# Altium footprint library pcb_ConnectorGeneral.PcbLib: 111 footprints (part 7 of 7)
Each footprint in its own frame and in the unit in brackets; x right, y up, seen from the top. Pads: shape width x height; smd on the part's side, far side on the other; paste and mask are expansions set on the pad; w line width, h text height; cw(c..) or ccw(c..) is an arc to the next point about the centre after c.
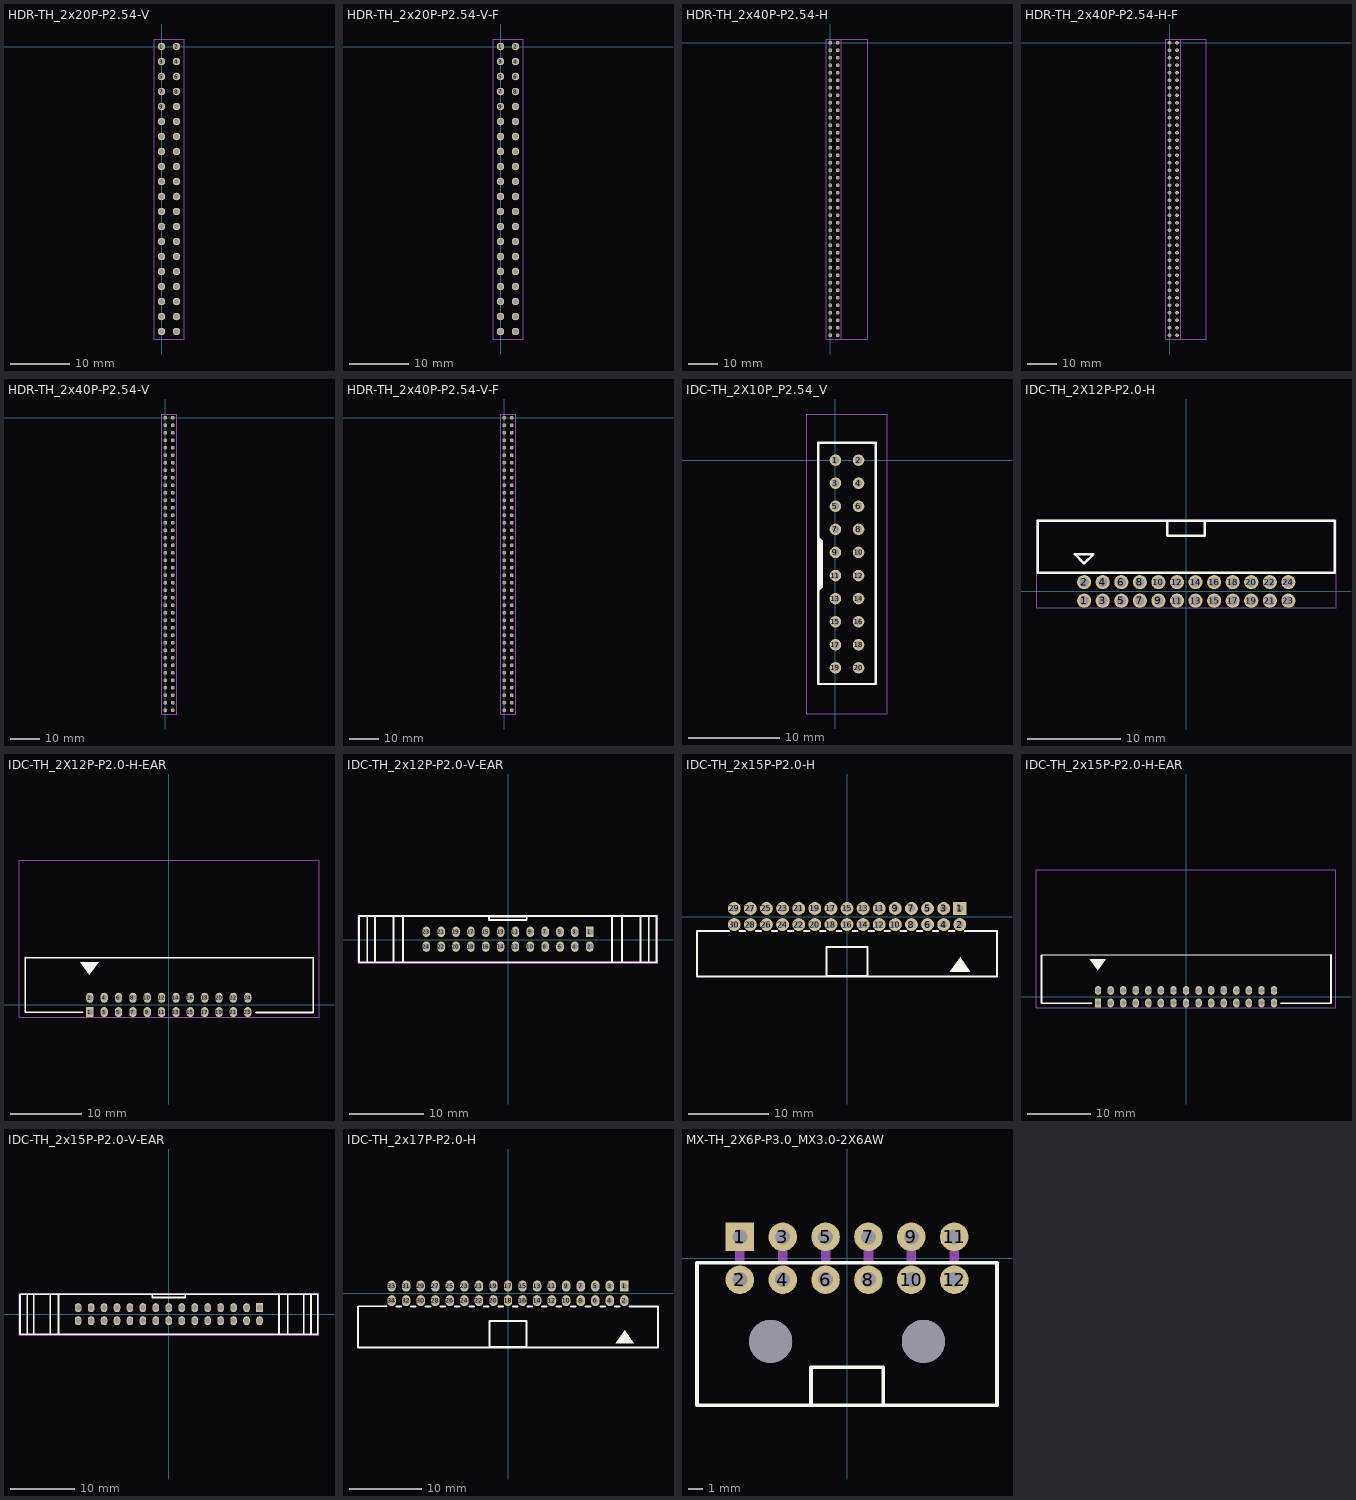
[diagram p6: the footprints below, top view; thin cyan lines are the x and y axes]

## HDR-TH_2x20P-P2.54-V [mil]
height 169.29
pads (40):
  round 50 hole 32: 1(0,0) 2(100,0) 3(0,-100) 4(100,-100) 5(0,-200) 6(100,-200) 7(0,-300) 8(100,-300) 9(0,-400) 10(100,-400) 11(0,-500) 12(100,-500) 13(0,-600) 14(100,-600) 15(0,-700) 16(100,-700) 17(0,-800) 18(100,-800) 19(0,-900) 20(100,-900) 21(0,-1000) 22(100,-1000) 23(0,-1100) 24(100,-1100) 25(0,-1200) 26(100,-1200) 27(0,-1300) 28(100,-1300) 29(0,-1400) 30(100,-1400) 31(0,-1500) 32(100,-1500) 33(0,-1600) 34(100,-1600) 35(0,-1700) 36(100,-1700) 37(0,-1800) 38(100,-1800) 39(0,-1900) 40(100,-1900)
Mechanical 13:
  lines w2: -50,-1950 -50,50 150,50 150,-1950 -50,-1950
Mechanical 14:
  lines w2: -50,-1950 -50,50 150,50 150,-1950 -50,-1950
Mechanical 16:
  text ".Designator" at 0,0 h39.37
3D body "pin_header_awl254-dg-g40d.stp": height 334.65, standoff -118.11, extent -50,-1950 150,50

## HDR-TH_2x20P-P2.54-V-F [mil]
height 169.29
pads (40):
  round 50 hole 32: 1(0,0) 2(100,0) 3(0,-100) 4(100,-100) 5(0,-200) 6(100,-200) 7(0,-300) 8(100,-300) 9(0,-400) 10(100,-400) 11(0,-500) 12(100,-500) 13(0,-600) 14(100,-600) 15(0,-700) 16(100,-700) 17(0,-800) 18(100,-800) 19(0,-900) 20(100,-900) 21(0,-1000) 22(100,-1000) 23(0,-1100) 24(100,-1100) 25(0,-1200) 26(100,-1200) 27(0,-1300) 28(100,-1300) 29(0,-1400) 30(100,-1400) 31(0,-1500) 32(100,-1500) 33(0,-1600) 34(100,-1600) 35(0,-1700) 36(100,-1700) 37(0,-1800) 38(100,-1800) 39(0,-1900) 40(100,-1900)
Mechanical 13:
  lines w2: -50,-1950 -50,50 150,50 150,-1950 -50,-1950
Mechanical 14:
  lines w2: -50,-1950 150,-1950 150,50 -50,50 -50,-1950
Mechanical 16:
  text ".Designator" at 0,0 h39.37
3D body "female_header_a-bl254-dg-g40d.stp": height 334.65, standoff -125.98, extent -48.42,-1954.92 148.43,54.92

## HDR-TH_2x40P-P2.54-H [mil]
height 169.29
pads (80):
  round 50 hole 32: 1(0,0) 2(100,0) 3(0,-100) 4(100,-100) 5(0,-200) 6(100,-200) 7(0,-300) 8(100,-300) 9(0,-400) 10(100,-400) 11(0,-500) 12(100,-500) 13(0,-600) 14(100,-600) 15(0,-700) 16(100,-700) 17(0,-800) 18(100,-800) 19(0,-900) 20(100,-900) 21(0,-1000) 22(100,-1000) 23(0,-1100) 24(100,-1100) 25(0,-1200) 26(100,-1200) 27(0,-1300) 28(100,-1300) 29(0,-1400) 30(100,-1400) 31(0,-1500) 32(100,-1500) 33(0,-1600) 34(100,-1600) 35(0,-1700) 36(100,-1700) 37(0,-1800) 38(100,-1800) 39(0,-1900) 40(100,-1900) 41(0,-2000) 42(100,-2000) 43(0,-2100) 44(100,-2100) 45(0,-2200) 46(100,-2200) 47(0,-2300) 48(100,-2300) 49(0,-2400) 50(100,-2400) 51(0,-2500) 52(100,-2500) 53(0,-2600) 54(100,-2600) 55(0,-2700) 56(100,-2700) 57(0,-2800) 58(100,-2800) 59(0,-2900) 60(100,-2900) 61(0,-3000) 62(100,-3000) 63(0,-3100) 64(100,-3100) 65(0,-3200) 66(100,-3200) 67(0,-3300) 68(100,-3300) 69(0,-3400) 70(100,-3400) 71(0,-3500) 72(100,-3500) 73(0,-3600) 74(100,-3600) 75(0,-3700) 76(100,-3700) 77(0,-3800) 78(100,-3800) 79(0,-3900) 80(100,-3900)
Mechanical 13:
  lines w2: -50,-3950 500,-3950 500,50 -50,50 -50,-3950
Mechanical 14:
  lines w2: -50,-3950 -50,50 150,50 150,-3950 -50,-3950
Mechanical 16:
  text ".Designator" at 0,0 h39.37
3D body "pin_header_awl254-da-g80d.stp": height 198.43, standoff -116.54, extent -12.44,-3945 494.65,55

## HDR-TH_2x40P-P2.54-H-F [mil]
height 169.29
pads (80):
  round 50 hole 32: 1(0,0) 2(100,0) 3(0,-100) 4(100,-100) 5(0,-200) 6(100,-200) 7(0,-300) 8(100,-300) 9(0,-400) 10(100,-400) 11(0,-500) 12(100,-500) 13(0,-600) 14(100,-600) 15(0,-700) 16(100,-700) 17(0,-800) 18(100,-800) 19(0,-900) 20(100,-900) 21(0,-1000) 22(100,-1000) 23(0,-1100) 24(100,-1100) 25(0,-1200) 26(100,-1200) 27(0,-1300) 28(100,-1300) 29(0,-1400) 30(100,-1400) 31(0,-1500) 32(100,-1500) 33(0,-1600) 34(100,-1600) 35(0,-1700) 36(100,-1700) 37(0,-1800) 38(100,-1800) 39(0,-1900) 40(100,-1900) 41(0,-2000) 42(100,-2000) 43(0,-2100) 44(100,-2100) 45(0,-2200) 46(100,-2200) 47(0,-2300) 48(100,-2300) 49(0,-2400) 50(100,-2400) 51(0,-2500) 52(100,-2500) 53(0,-2600) 54(100,-2600) 55(0,-2700) 56(100,-2700) 57(0,-2800) 58(100,-2800) 59(0,-2900) 60(100,-2900) 61(0,-3000) 62(100,-3000) 63(0,-3100) 64(100,-3100) 65(0,-3200) 66(100,-3200) 67(0,-3300) 68(100,-3300) 69(0,-3400) 70(100,-3400) 71(0,-3500) 72(100,-3500) 73(0,-3600) 74(100,-3600) 75(0,-3700) 76(100,-3700) 77(0,-3800) 78(100,-3800) 79(0,-3900) 80(100,-3900)
Mechanical 13:
  lines w2: -50,-3950 -50,50 490,50 490,-3950 -50,-3950
Mechanical 14:
  lines w2: -50,-3950 150,-3950 150,50 -50,50 -50,-3950
Mechanical 16:
  text ".Designator" at 0,0 h39.37
3D body "female_header_a-bl254-da-g80d.stp": height 198.43, standoff -124.41, extent -10,-3949.92 486.06,59.92

## HDR-TH_2x40P-P2.54-V [mil]
height 169.29
pads (80):
  round 50 hole 32: 1(0,0) 2(100,0) 3(0,-100) 4(100,-100) 5(0,-200) 6(100,-200) 7(0,-300) 8(100,-300) 9(0,-400) 10(100,-400) 11(0,-500) 12(100,-500) 13(0,-600) 14(100,-600) 15(0,-700) 16(100,-700) 17(0,-800) 18(100,-800) 19(0,-900) 20(100,-900) 21(0,-1000) 22(100,-1000) 23(0,-1100) 24(100,-1100) 25(0,-1200) 26(100,-1200) 27(0,-1300) 28(100,-1300) 29(0,-1400) 30(100,-1400) 31(0,-1500) 32(100,-1500) 33(0,-1600) 34(100,-1600) 35(0,-1700) 36(100,-1700) 37(0,-1800) 38(100,-1800) 39(0,-1900) 40(100,-1900) 41(0,-2000) 42(100,-2000) 43(0,-2100) 44(100,-2100) 45(0,-2200) 46(100,-2200) 47(0,-2300) 48(100,-2300) 49(0,-2400) 50(100,-2400) 51(0,-2500) 52(100,-2500) 53(0,-2600) 54(100,-2600) 55(0,-2700) 56(100,-2700) 57(0,-2800) 58(100,-2800) 59(0,-2900) 60(100,-2900) 61(0,-3000) 62(100,-3000) 63(0,-3100) 64(100,-3100) 65(0,-3200) 66(100,-3200) 67(0,-3300) 68(100,-3300) 69(0,-3400) 70(100,-3400) 71(0,-3500) 72(100,-3500) 73(0,-3600) 74(100,-3600) 75(0,-3700) 76(100,-3700) 77(0,-3800) 78(100,-3800) 79(0,-3900) 80(100,-3900)
Mechanical 13:
  lines w2: -50,-3950 150,-3950 150,50 -50,50 -50,-3950
Mechanical 14:
  lines w2: -50,-3950 -50,50 150,50 150,-3950 -50,-3950
Mechanical 16:
  text ".Designator" at 0,0 h39.37

## HDR-TH_2x40P-P2.54-V-F [mil]
height 169.29
pads (80):
  round 50 hole 32: 1(0,0) 2(100,0) 3(0,-100) 4(100,-100) 5(0,-200) 6(100,-200) 7(0,-300) 8(100,-300) 9(0,-400) 10(100,-400) 11(0,-500) 12(100,-500) 13(0,-600) 14(100,-600) 15(0,-700) 16(100,-700) 17(0,-800) 18(100,-800) 19(0,-900) 20(100,-900) 21(0,-1000) 22(100,-1000) 23(0,-1100) 24(100,-1100) 25(0,-1200) 26(100,-1200) 27(0,-1300) 28(100,-1300) 29(0,-1400) 30(100,-1400) 31(0,-1500) 32(100,-1500) 33(0,-1600) 34(100,-1600) 35(0,-1700) 36(100,-1700) 37(0,-1800) 38(100,-1800) 39(0,-1900) 40(100,-1900) 41(0,-2000) 42(100,-2000) 43(0,-2100) 44(100,-2100) 45(0,-2200) 46(100,-2200) 47(0,-2300) 48(100,-2300) 49(0,-2400) 50(100,-2400) 51(0,-2500) 52(100,-2500) 53(0,-2600) 54(100,-2600) 55(0,-2700) 56(100,-2700) 57(0,-2800) 58(100,-2800) 59(0,-2900) 60(100,-2900) 61(0,-3000) 62(100,-3000) 63(0,-3100) 64(100,-3100) 65(0,-3200) 66(100,-3200) 67(0,-3300) 68(100,-3300) 69(0,-3400) 70(100,-3400) 71(0,-3500) 72(100,-3500) 73(0,-3600) 74(100,-3600) 75(0,-3700) 76(100,-3700) 77(0,-3800) 78(100,-3800) 79(0,-3900) 80(100,-3900)
Mechanical 14:
  lines w2: -50,-3950 -50,50 150,50 150,-3950 -50,-3950
Mechanical 16:
  text ".Designator" at 0,0 h39.37
3D body "female_header_a-bl254-dg-g80d.stp": height 334.65, standoff -125.98, extent -48.42,-3954.92 148.43,54.92

## IDC-TH_2X10P_P2.54_V [mil]
height 169.29
pads (20):
  round 50 hole 32: 1(0,0) 2(100,0) 3(0,-100) 4(100,-100) 5(0,-200) 6(100,-200) 7(0,-300) 8(100,-300) 9(0,-400) 10(100,-400) 11(0,-500) 12(100,-500) 13(0,-600) 14(100,-600) 15(0,-700) 16(100,-700) 17(0,-800) 18(100,-800) 19(0,-900) 20(100,-900)
Top Overlay:
  region: -75,-335 -75,-565 -60,-550 -60,-350
  lines w10: -75,-565 -60,-550 -60,-350 -75,-335 ; -75,-565 -75,-970 175,-970 175,75 -75,75 -75,-335 ; -75,-565 -75,-335
Mechanical 13:
  lines w2: -125,-1100 225,-1100 225,200 -125,200 -125,-1100
Mechanical 14:
  lines w2: -125,-1100 -125,200 225,200 225,-1100 -125,-1100
Mechanical 16:
  text ".Designator" at 0,0 h39.37
3D body "SW3dPS-PinBox Connector_20Pin.STEP": height 429.13, standoff -118.11, extent -123.23,-1100 223.23,199.21

## IDC-TH_2X12P-P2.0-H [mil]
pads (24):
  round 60 hole 39.37: 1(-433.05,-39.35) 2(-433.05,39.35) 3(-354.35,-39.35) 4(-354.35,39.35) 5(-275.55,-39.35) 6(-275.55,39.35) 7(-196.85,-39.35) 8(-196.85,39.35) 9(-118.15,-39.35) 10(-118.15,39.35) 11(-39.35,-39.35) 12(-39.35,39.35) 13(39.35,-39.35) 14(39.35,39.35) 15(118.15,-39.35) 16(118.15,39.35) 17(196.85,-39.35) 18(196.85,39.35) 19(275.55,-39.35) 20(275.55,39.35) 21(354.35,-39.35) 22(354.35,39.35) 23(433.05,-39.35) 24(433.05,39.35)
Top Overlay:
  lines w10: -79.95,238.75 -79.95,298.75 ; -78.69,236.23 78.79,236.23 78.79,297.49 80.05,298.75 ; -629.87,78.75 -629.87,299.22 629.97,299.22 629.97,78.75 -629.87,78.75 ; -472.39,157.49 -433.02,118.12 -393.65,157.49 -472.39,157.49
Mechanical 15:
  drawing of 29 lines, arcs and shapes, not listed
Mechanical 16:
  text ".Designator" at 0,0 h39.37
3D body "3D_PCB1_2024-05-08.step": height 216.57, standoff -110.24, extent -616.93,-48.23 616.93,308.07

## IDC-TH_2X12P-P2.0-H-EAR [mil]
pads (24):
  rect 40x55 hole 32: 1(-433.08,-39.37)
  oval 40x55 hole 32: 2(-433.07,39.37) 3(-354.32,-39.37) 4(-354.33,39.37) 5(-275.58,-39.37) 6(-275.59,39.37) 7(-196.84,-39.37) 8(-196.85,39.37) 9(-118.1,-39.37) 10(-118.11,39.37) 11(-39.37,-39.37) 12(-39.37,39.37) 13(39.38,-39.37) 14(39.37,39.37) 15(118.12,-39.37) 16(118.11,39.37) 17(196.86,-39.37) 18(196.85,39.37) 19(275.6,-39.37) 20(275.59,39.37) 21(354.34,-39.37) 22(354.33,39.37) 23(433.08,-39.37) 24(433.07,39.37)
Top Overlay:
  region: -435,165 -385,235 -485,235
  lines w10: -473.19,-40 -787.54,-40 -787.54,260 793,257.97 ; 478.62,-41.17 793,-41.17 793,260
Mechanical 15:
  drawing of 29 lines, arcs and shapes, not listed
Mechanical 16:
  text ".Designator" at 0,0 h39.37
3D body "3D_PCB1_2024-05-14.step": height 242.16, standoff -116.11, extent -868.61,-63.32 868.06,768.05

## IDC-TH_2x12P-P2.0-V-EAR [mil]
pads (24):
  rect 40x55 hole 32: 1(432.84,41.42)
  oval 40x55 hole 32: 2(432.84,-37.33) 3(354.09,41.41) 4(354.1,-37.33) 5(275.35,41.41) 6(275.36,-37.33) 7(196.61,41.41) 8(196.62,-37.33) 9(117.87,41.41) 10(117.88,-37.33) 11(39.14,41.41) 12(39.14,-37.33) 13(-39.61,41.41) 14(-39.6,-37.33) 15(-118.35,41.41) 16(-118.34,-37.33) 17(-197.09,41.41) 18(-197.08,-37.33) 19(-275.83,41.41) 20(-275.82,-37.33) 21(-354.57,41.41) 22(-354.56,-37.33) 23(-433.31,41.41) 24(-433.3,-37.33)
Top Overlay:
  lines w10: -790,-120 -790,124.09 ; -787.64,-120 787.16,-120 787.16,124.09 -787.64,124.09 ; -746.02,-120 -746.02,124.09 ; -705.52,-120 -705.52,124.09 ; -606.52,-120 -606.52,124.09 ; -555.69,-120 -555.69,124.09 ; 551.2,-120 551.2,124.09 ; 603.7,-120 603.7,124.09 ; 701.7,-120 701.7,124.09 ; 745.7,-120 745.7,124.09 ; -101.02,103.07 -101.02,123.07 98.98,123.07 98.98,103.07 -101.02,103.07
Mechanical 15:
  drawing of 29 lines, arcs and shapes, not listed
Mechanical 16:
  text ".Designator" at 0,0 h39.37
3D body "3D_PCB1_2024-05-28.step": height 832.36, standoff -117.11, extent -869.24,-120.08 867.43,120.08

## IDC-TH_2x15P-P2.0-H [mm]
pads (30):
  rect 1.7x1.6 hole 0.9: 1(14,1)
  round 1.6 hole 0.9: 2(14,-1) 3(12,1) 4(12,-1) 5(10,1) 6(10,-1) 7(8,1) 8(8,-1) 9(6,1) 10(6,-1) 11(4,1) 12(4,-1) 13(2,1) 14(2,-1) 15(0,1) 16(0,-1) 17(-2,1) 18(-2,-1) 19(-4,1) 20(-4,-1) 21(-6,1) 22(-6,-1) 23(-8,1) 24(-8,-1) 25(-10,1) 26(-10,-1) 27(-12,1) 28(-12,-1) 29(-14,1) 30(-14,-1)
Top Overlay:
  region: 14.05,-5.08 12.78,-6.858 15.32,-6.858
  lines w0.254: -14.675,-1.778 -18.622,-1.778 -18.622,-7.428 18.622,-7.428 18.622,-1.778 14.675,-1.778 ; -13.325,-1.778 -12.675,-1.778 ; -11.325,-1.778 -10.675,-1.778 ; -9.325,-1.778 -8.675,-1.778 ; -7.325,-1.778 -6.675,-1.778 ; -5.325,-1.778 -4.675,-1.778 ; -3.325,-1.778 -2.675,-1.778 ; -1.325,-1.778 -0.675,-1.778 ; 0.675,-1.778 1.325,-1.778 ; 2.675,-1.778 3.325,-1.778 ; 4.675,-1.778 5.325,-1.778 ; 6.675,-1.778 7.325,-1.778 ; 8.675,-1.778 9.325,-1.778 ; 10.675,-1.778 11.325,-1.778 ; 12.675,-1.778 13.325,-1.778 ; -2.54,-7.366 -2.54,-3.81 2.54,-3.81 2.54,-7.366 -2.54,-7.366
Mechanical 16:
  text ".Designator" at 0,0 h1
3D body "3D_PCB1_2024-05-08.step": height 5.08, standoff -2.77, extent -18.655,-7.694 18.655,1.256

## IDC-TH_2x15P-P2.0-H-EAR [mil]
pads (30):
  rect 40x55 hole 32: 1(-551.18,-39.37)
  oval 40x55 hole 32: 2(-551.18,39.37) 3(-472.43,-39.37) 4(-472.44,39.37) 5(-393.69,-39.37) 6(-393.7,39.37) 7(-314.95,-39.37) 8(-314.96,39.37) 9(-236.21,-39.37) 10(-236.22,39.37) 11(-157.48,-39.37) 12(-157.48,39.37) 13(-78.73,-39.37) 14(-78.74,39.37) 15(0.01,-39.37) 16(0,39.37) 17(78.75,-39.37) 18(78.74,39.37) 19(157.49,-39.37) 20(157.48,39.37) 21(236.23,-39.37) 22(236.22,39.37) 23(314.97,-39.37) 24(314.96,39.37) 25(393.71,-39.37) 26(393.7,39.37) 27(472.45,-39.37) 28(472.44,39.37) 29(551.18,-39.37) 30(551.18,39.37)
Top Overlay:
  region: -553.11,165 -503.11,235 -603.1,235
  lines w10: -591.3,-40 -905.64,-40 -905.64,260 908,263.3 ; 593.62,-41.17 908,-41.17 908,260
Mechanical 15:
  drawing of 35 lines, arcs and shapes, not listed
Mechanical 16:
  text ".Designator" at 0,0 h39.37
3D body "3D_PCB1_2024-05-14.step": height 242.16, standoff -116.11, extent -986.72,-63.32 986.17,768.05

## IDC-TH_2x15P-P2.0-V-EAR [mil]
pads (30):
  rect 40x55 hole 32: 1(551.18,39.37)
  oval 40x55 hole 32: 2(551.18,-39.37) 3(472.43,39.37) 4(472.44,-39.37) 5(393.69,39.37) 6(393.7,-39.37) 7(314.95,39.37) 8(314.96,-39.37) 9(236.21,39.37) 10(236.22,-39.37) 11(157.48,39.37) 12(157.48,-39.37) 13(78.73,39.37) 14(78.74,-39.37) 15(-0.01,39.37) 16(0,-39.37) 17(-78.75,39.37) 18(-78.74,-39.37) 19(-157.49,39.37) 20(-157.48,-39.37) 21(-236.23,39.37) 22(-236.22,-39.37) 23(-314.97,39.37) 24(-314.96,-39.37) 25(-393.71,39.37) 26(-393.7,-39.37) 27(-472.45,39.37) 28(-472.44,-39.37) 29(-551.18,39.37) 30(-551.18,-39.37)
Top Overlay:
  lines w10: -905.51,-122.05 905.51,-122.05 905.51,122.05 -905.51,122.05 ; -904.33,-122.05 -904.33,122.05 ; -860.35,-122.05 -860.35,122.05 ; -819.85,-122.05 -819.85,122.05 ; -720.85,-122.05 -720.85,122.05 ; -670.02,-122.05 -670.02,122.05 ; 669.54,-122.05 669.54,122.05 ; 722.04,-122.05 722.04,122.05 ; 820.04,-122.05 820.04,122.05 ; 864.04,-122.05 864.04,122.05 ; -100.39,101.18 99.61,101.18 99.61,121.18 -100.39,121.18 -100.39,101.18
Mechanical 15:
  drawing of 35 lines, arcs and shapes, not listed
Mechanical 16:
  text ".Designator" at 0,0 h39.37
3D body "3D_PCB1_2024-05-28.step": height 832.36, standoff -117.11, extent -986.17,-120.08 986.72,120.08

## IDC-TH_2x17P-P2.0-H [mil]
pads (34):
  rect 45x60 hole 35: 1(629.92,39.37)
  oval 45x60 hole 35: 2(629.92,-39.37) 3(551.18,39.37) 4(551.18,-39.37) 5(472.44,39.37) 6(472.44,-39.37) 7(393.7,39.37) 8(393.7,-39.37) 9(314.96,39.37) 10(314.96,-39.37) 11(236.22,39.37) 12(236.22,-39.37) 13(157.48,39.37) 14(157.48,-39.37) 15(78.74,39.37) 16(78.74,-39.37) 17(0,39.37) 18(0,-39.37) 19(-78.74,39.37) 20(-78.74,-39.37) 21(-157.48,39.37) 22(-157.48,-39.37) 23(-236.22,39.37) 24(-236.22,-39.37) 25(-314.96,39.37) 26(-314.96,-39.37) 27(-393.7,39.37) 28(-393.7,-39.37) 29(-472.44,39.37) 30(-472.44,-39.37) 31(-551.18,39.37) 32(-551.18,-39.37) 33(-629.92,39.37) 34(-629.92,-39.37)
Top Overlay:
  region: 631.89,-200 581.89,-270 681.89,-270
  lines w10: -656.51,-70 -811.89,-70 -811.89,-292.44 811.89,-292.44 811.89,-70 656.51,-70 ; -603.33,-70 -577.77,-70 ; -524.59,-70 -499.03,-70 ; -445.85,-70 -420.29,-70 ; -367.11,-70 -341.55,-70 ; -288.37,-70 -262.81,-70 ; -209.63,-70 -184.07,-70 ; -130.89,-70 -105.33,-70 ; -52.15,-70 -26.59,-70 ; 26.59,-70 52.15,-70 ; 105.33,-70 130.89,-70 ; 184.07,-70 209.63,-70 ; 262.81,-70 288.37,-70 ; 341.55,-70 367.11,-70 ; 420.29,-70 445.85,-70 ; 499.03,-70 524.59,-70 ; 577.77,-70 603.33,-70 ; -100,-290 -100,-150 100,-150 100,-290 -100,-290
Mechanical 16:
  text ".Designator" at 0,0 h39.37
3D body "3D_PCB1_2024-05-08.step": height 217.54, standoff -109.24, extent -813.19,-302.24 813.19,50.12

## MX-TH_2X6P-P3.0_MX3.0-2X6AW [mm]
pads (14):
  rect 2x2 hole 1.05 paste-2539.97 mask+0.05: 1(-7.5,1.5)
  round 2 hole 1.05 paste-2539.97 mask+0.05: 2(-7.5,-1.5) 3(-4.5,1.5) 4(-4.5,-1.5) 5(-1.5,1.5) 6(-1.5,-1.5) 7(1.5,1.5) 8(1.5,-1.5) 9(4.5,1.5) 10(4.5,-1.5) 11(7.5,1.5) 12(7.5,-1.5)
  round 3 hole 3 unplated: ""(-5.35,-5.82) ""(5.35,-5.82)
Top Overlay:
  lines w0.254: -2.523,-10.3 -2.523,-7.62 2.54,-7.62 2.54,-10.3 ; -10.5,-10.3 -10.5,-0.3 10.5,-0.3 10.5,-10.3 -10.5,-10.3
Keep-Out Layer:
  board cut-out: 6.85,-5.82 6.849,-5.673 6.79,-5.385 6.675,-5.114 6.511,-4.871 6.302,-4.664 6.057,-4.501 5.786,-4.389 5.497,-4.332 5.203,-4.332 4.915,-4.389 4.643,-4.501 4.398,-4.664 4.19,-4.871 4.025,-5.114 3.911,-5.385 3.851,-5.673 3.85,-5.82 3.851,-5.967 3.911,-6.255 4.025,-6.526 4.19,-6.769 4.398,-6.976 4.643,-7.139 4.915,-7.251 5.203,-7.308 5.497,-7.308 5.785,-7.251 6.057,-7.139 6.302,-6.976 6.511,-6.769 6.675,-6.526 6.789,-6.255 6.849,-5.967
  board cut-out: -3.85,-5.82 -3.851,-5.673 -3.91,-5.385 -4.025,-5.114 -4.189,-4.871 -4.398,-4.664 -4.643,-4.501 -4.914,-4.389 -5.203,-4.332 -5.497,-4.332 -5.785,-4.389 -6.057,-4.501 -6.302,-4.664 -6.51,-4.871 -6.675,-5.114 -6.789,-5.385 -6.849,-5.673 -6.85,-5.82 -6.849,-5.967 -6.789,-6.255 -6.675,-6.526 -6.51,-6.769 -6.302,-6.976 -6.057,-7.139 -5.785,-7.251 -5.497,-7.308 -5.203,-7.308 -4.915,-7.251 -4.643,-7.139 -4.398,-6.976 -4.189,-6.769 -4.025,-6.526 -3.911,-6.255 -3.851,-5.967
Mechanical 15:
  region: 1.82,1.82 1.82,-0.31 1.18,-0.31 1.18,1.82
  region: 4.82,1.82 4.82,-0.31 4.18,-0.31 4.18,1.82
  region: 7.82,1.82 7.82,-0.31 7.18,-0.31 7.18,1.82
  region: -1.18,1.82 -1.18,-0.31 -1.82,-0.31 -1.82,1.82
  region: -4.18,1.82 -4.18,-0.31 -4.82,-0.31 -4.82,1.82
  region: -7.18,1.82 -7.18,-0.31 -7.82,-0.31 -7.82,1.82
  region: -7.82,1.82 -7.18,1.82 -7.18,1.18 -7.82,1.18
  region: -7.82,-1.18 -7.18,-1.18 -7.18,-1.82 -7.82,-1.82
  region: -4.82,1.82 -4.18,1.82 -4.18,1.18 -4.82,1.18
  region: -4.82,-1.18 -4.18,-1.18 -4.18,-1.82 -4.82,-1.82
  region: -1.82,1.82 -1.18,1.82 -1.18,1.18 -1.82,1.18
  region: -1.82,-1.18 -1.18,-1.18 -1.18,-1.82 -1.82,-1.82
  region: 1.18,1.82 1.82,1.82 1.82,1.18 1.18,1.18
  region: 1.18,-1.18 1.82,-1.18 1.82,-1.82 1.18,-1.82
  region: 4.18,1.82 4.82,1.82 4.82,1.18 4.18,1.18
  region: 4.18,-1.18 4.82,-1.18 4.82,-1.82 4.18,-1.82
  region: 7.18,1.82 7.82,1.82 7.82,1.18 7.18,1.18
  region: 7.18,-1.18 7.82,-1.18 7.82,-1.82 7.18,-1.82
  lines w0.051: -10.5,-10.3 10.5,-10.3 10.5,-0.3 -10.5,-0.3 -10.5,-10.3
Mechanical 16:
  text ".Designator" at 0,0 h1
3D body "3D_PCB1_2024-05-11.step": height 8.85, standoff -3.15, extent -10.651,-10.186 10.359,1.914